# Altium footprint library FootprintSMD.PcbLib: 140 footprints (part 7 of 9)
Each footprint in its own frame and in the unit in brackets; x right, y up, seen from the top. Pads: shape width x height; smd on the part's side, far side on the other; paste and mask are expansions set on the pad; w line width, h text height; cw(c..) or ccw(c..) is an arc to the next point about the centre after c.
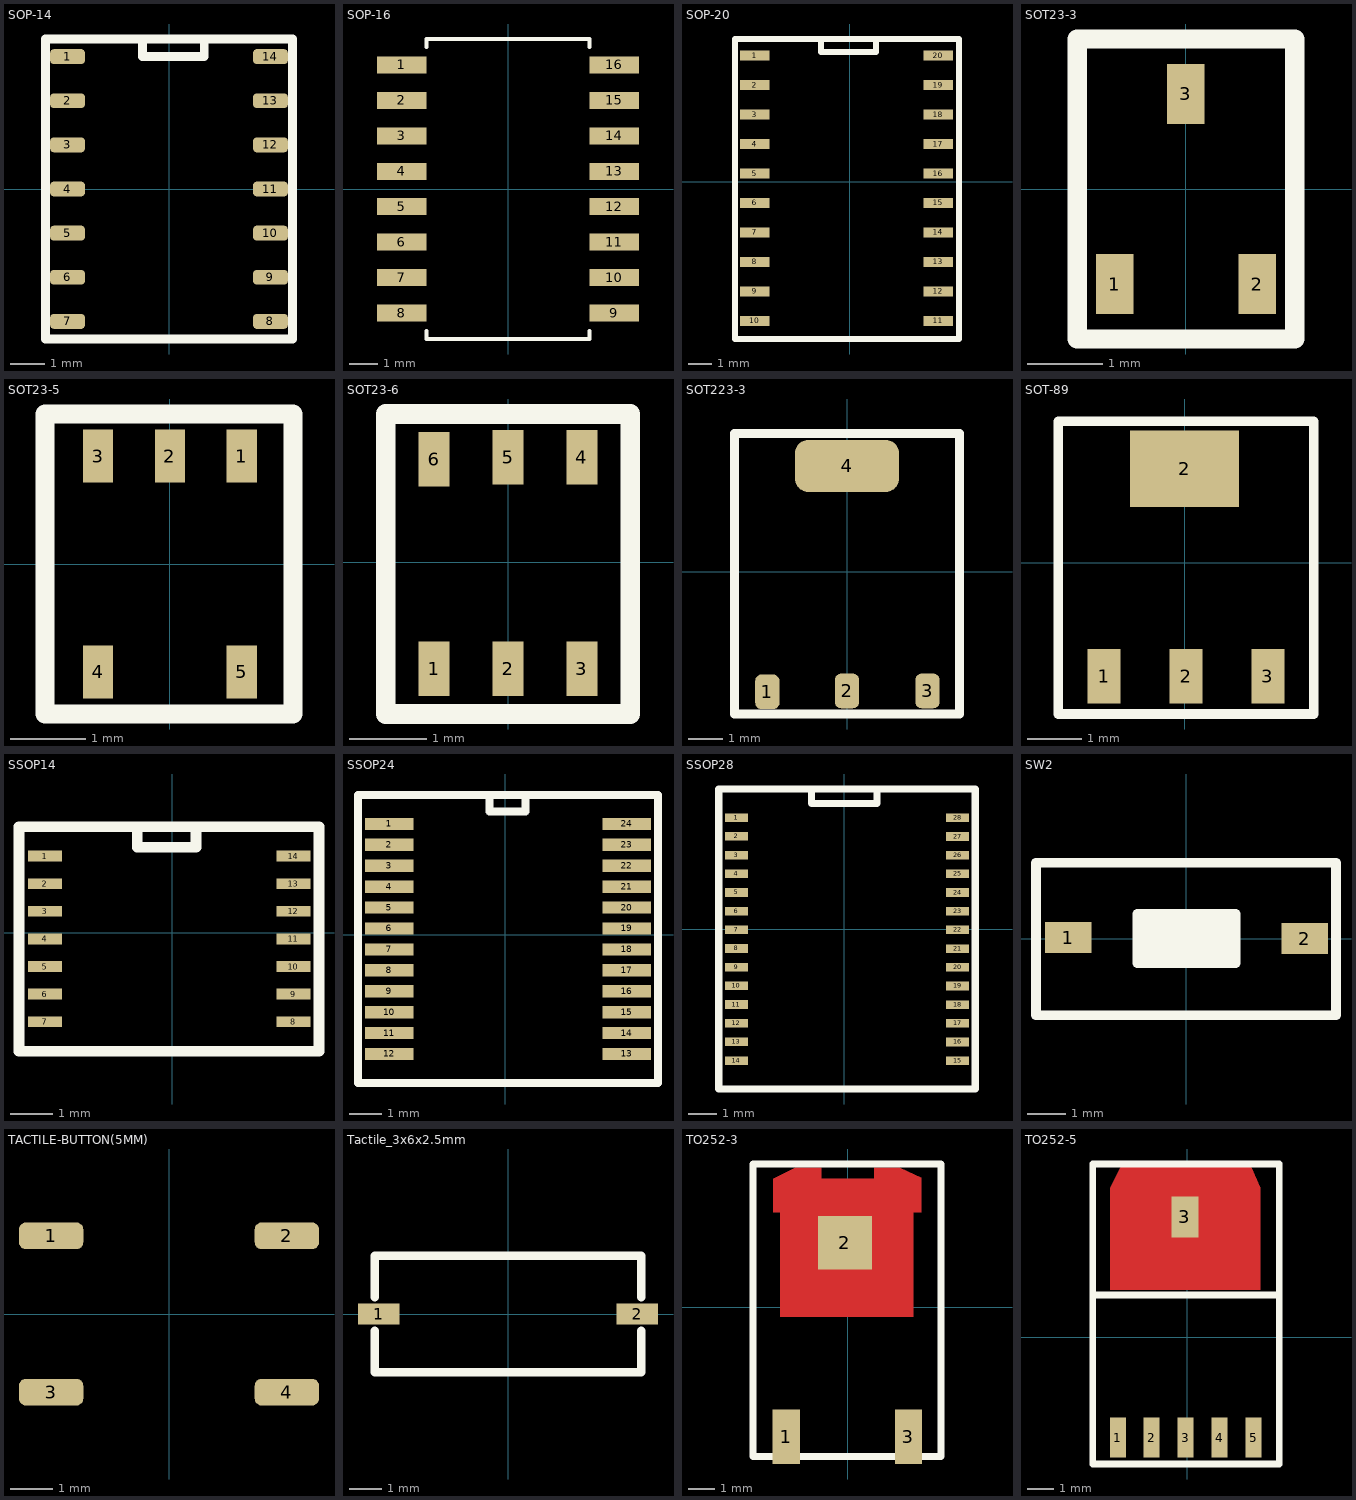
[diagram p6: the footprints below, top view; thin cyan lines are the x and y axes]

## SOP-14 [mm]
pads (14):
  rrect50% 1x0.43 smd: 1(-2.921,3.81) 2(-2.921,2.54) 3(-2.921,1.27) 4(-2.921,0) 5(-2.921,-1.27) 6(-2.921,-2.54) 7(-2.921,-3.81) 8(2.921,-3.81) 9(2.921,-2.54) 10(2.921,-1.27) 11(2.921,0) 12(2.921,1.27) 13(2.921,2.54) 14(2.921,3.81)
Top Overlay:
  lines w0.254: -0.762,4.318 -0.762,3.81 1.016,3.81 1.016,4.318 ; -3.556,-4.318 3.556,-4.318 3.556,4.318 -3.556,4.318 -3.556,-4.318
3D body "User Library-14-SOP.STEP": height 1.8, standoff 0, extent -3,-4.28 3,4.28

## SOP-16 [mil]
pads (16):
  rect 70x24 smd paste+0 mask+0: 1(-150,175) 2(-150,125) 3(-150,75) 4(-150,25) 5(-150,-25) 6(-150,-75) 7(-150,-125) 8(-150,-175) 9(150,-175) 10(150,-125) 11(150,-75) 12(150,-25) 13(150,25) 14(150,75) 15(150,125) 16(150,175)
Top Overlay:
  lines w6: -115,-200.1 -115,-211.5 115,-211.5 115,-200.1 ; -115,200.1 -115,211.5 115,211.5 115,200.1
3D body "NS16-M.step": height 79.09, standoff 0, extent -161.49,-206.49 161.51,206.51

## SOP-20 [mm]
pads (20):
  rect 1.27x0.432 smd: 1(-4.1,5.43) 2(-4.1,4.16) 3(-4.1,2.89) 4(-4.1,1.62) 5(-4.1,0.35) 6(-4.1,-0.92) 7(-4.1,-2.19) 8(-4.1,-3.46) 9(-4.1,-4.73) 10(-4.1,-6) 11(3.799,-6) 12(3.799,-4.73) 13(3.799,-3.46) 14(3.799,-2.19) 15(3.799,-0.92) 16(3.799,0.35) 17(3.799,1.62) 18(3.799,2.89) 19(3.799,4.16) 20(3.799,5.43)
Top Overlay:
  lines w0.254: -1.25,6.121 -1.25,5.588 1.125,5.588 1.125,6.147 ; -4.953,-6.782 4.699,-6.782 4.699,6.147 -4.953,6.147 -4.953,-6.782
3D body "User Library-SOP20.STEP": height 2, standoff 0, extent -4.227,-6.648 3.873,6.052

## SOT23-3 [mm]
pads (3):
  rect 0.5x0.8 smd: 1(-0.95,-1.27) 2(0.95,-1.27) 3(0,1.27)
Top Overlay:
  lines w0.254: -1.45,-2 -1.45,2 1.45,2 1.45,-2 -1.45,-2
3D body "User Library-SOT23-3.STEP": height 1.3, standoff 0, extent -1.45,-1.4 1.45,1.4

## SOT23-5 [mm]
pads (5):
  rect 0.4x0.7 smd: 1(0.95,1.424) 2(0,1.424) 3(-0.95,1.424) 4(-0.95,-1.425) 5(0.95,-1.425)
Top Overlay:
  lines w0.254: -1.651,-1.981 1.626,-1.981 1.626,1.981 -1.651,1.981 -1.651,-1.981
3D body "User Library-SOT-23-5.STEP": height 1.45, standoff -0.01, extent -1.5,-1.5 1.5,1.5

## SOT23-6 [mm]
pads (6):
  rect 0.4x0.7 smd: 1(-0.95,-1.375) 2(0,-1.375) 3(0.95,-1.375) 4(0.95,1.35) 5(0,1.35) 6(-0.95,1.325)
Top Overlay:
  lines w0.254: -1.575,-1.956 -1.575,1.905 1.575,1.905 1.575,-1.956 -1.575,-1.956
3D body "User Library-SOT23-6-2.STEP": height 1.45, standoff 0, extent -1.45,-1.4 1.45,1.4

## SOT223-3 [mm]
pads (4):
  rrect50% 0.7x1 smd: 1(-2.3,-3.475) 2(0,-3.45) 3(2.325,-3.45)
  rrect50% 3x1.5 smd: 4(0,3.048)
Top Overlay:
  lines w0.254: -3.25,-4.115 3.25,-4.115 3.25,3.988 -3.25,3.988 -3.25,-4.115
3D body "User Library-SOT223-3.STEP": height 1.7, standoff 0, extent -3.25,-3.5 3.25,3.5

## SOT-89 [mm]
pads (4):
  rect 0.6x1 smd: 1(-1.475,-2.075) 2(0.027,-2.079) 3(1.525,-2.075)
  rect 2x1.4 smd: 2(0,1.725)
Top Overlay:
  lines w0.178: -2.311,-2.769 2.362,-2.769 2.362,2.591 -2.311,2.591 -2.311,-2.769
3D body "User Library-SOT-89-1.step": height 1.51, standoff 0, extent -2.223,-2.304 2.277,1.996

## SSOP14 [mm]
pads (14):
  rect 0.8x0.254 smd: 1(-3,1.8) 2(-3,1.15) 3(-3,0.5) 4(-3,-0.15) 5(-3,-0.8) 6(-3,-1.45) 7(-3,-2.1) 8(2.85,-2.1) 9(2.85,-1.45) 10(2.85,-0.8) 11(2.85,-0.15) 12(2.85,0.5) 13(2.85,1.15) 14(2.85,1.8)
Top Overlay:
  lines w0.254: -0.826,2.464 -0.826,2.007 0.559,2.007 0.559,2.464 ; -3.607,-2.794 -3.607,2.489 3.454,2.489 3.454,-2.794 -3.607,-2.794
3D body "User Library-SSOP14-P065.STEP": height 1.73, standoff -0.08, extent -3.075,-2.65 2.925,2.35

## SSOP24 [mm]
pads (24):
  rect 1.5x0.38 smd: 1(-3.6,3.45) 2(-3.6,2.8) 3(-3.6,2.15) 4(-3.6,1.5) 5(-3.6,0.85) 6(-3.6,0.2) 7(-3.6,-0.45) 8(-3.6,-1.1) 9(-3.6,-1.75) 10(-3.6,-2.4) 11(-3.6,-3.05) 12(-3.6,-3.7) 13(3.775,-3.7) 14(3.775,-3.05) 15(3.775,-2.4) 16(3.775,-1.75) 17(3.775,-1.1) 18(3.775,-0.45) 19(3.775,0.2) 20(3.775,0.85) 21(3.775,1.5) 22(3.775,2.15) 23(3.775,2.8) 24(3.775,3.45)
Top Overlay:
  lines w0.254: -0.483,4.343 -0.483,3.835 0.635,3.835 0.635,4.293 ; -4.572,-4.597 -4.572,4.343 4.75,4.343 4.75,-4.597 -4.572,-4.597
3D body "User Library-SSOP 24 PIN_.STEP": height 1.93, standoff -0.06, extent -3.85,-4.43 4.05,4.2

## SSOP28 [mm]
pads (28):
  rect 0.8x0.3 smd: 1(-3.76,3.877) 2(-3.76,3.227) 3(-3.76,2.577) 4(-3.76,1.927) 5(-3.76,1.277) 6(-3.76,0.627) 7(-3.76,-0.023) 8(-3.76,-0.673) 9(-3.76,-1.323) 10(-3.76,-1.973) 11(-3.76,-2.623) 12(-3.76,-3.273) 13(-3.76,-3.923) 14(-3.76,-4.573) 15(3.937,-4.577) 16(3.937,-3.926) 17(3.937,-3.277) 18(3.937,-2.626) 19(3.937,-1.977) 20(3.937,-1.326) 21(3.937,-0.677) 22(3.937,-0.026) 23(3.937,0.623) 24(3.937,1.274) 25(3.937,1.923) 26(3.937,2.574) 27(3.937,3.223) 28(3.937,3.873)
Top Overlay:
  lines w0.254: -1.143,4.826 -1.143,4.369 1.13,4.369 1.13,4.864 ; -4.369,-5.563 3.492,-5.563 4.547,-5.563 4.547,4.877 -4.369,4.877 -4.369,-5.563
3D body "User Library-SSOP-28-3.STEP": height 1.9, standoff 0, extent -3.775,-5.425 4.025,4.775

## SW2 [mm]
pads (2):
  rect 1.2x0.8 smd: 1(-3.048,0.025) 2(3.048,0)
Top Overlay:
  rectangle: -1.27,-0.635 1.27,0.635
  lines w0.254: -3.886,-1.981 -3.886,1.956 3.861,1.956 3.861,-1.981 -3.886,-1.981 ; -1.27,-0.635 1.27,-0.635 1.27,0.635 -1.27,0.635 -1.27,-0.635
3D body "User Library-Button-SMD.step": height 2.5, standoff 0, extent -3.05,-1.85 3.05,1.85

## TACTILE-BUTTON(5MM) [mil]
pads (4):
  rrect50% 60x25 smd: 1(-110,73) 2(110,73) 3(-110,-73) 4(110,-73)
3D body "TactileButton(5mm)_SMD.stp": height 59.06, standoff 0, extent -126.57,-100.79 127.37,100

## Tactile_3x6x2.5mm [mil]
pads (2):
  rect 50x25 smd: 1(-155,0) 2(155,0)
Top Overlay:
  lines w10: -160,-20 -160,-70 160,-70 160,-20 ; -160,20 -160,70 160,70 160,20
3D body "Tactile_SMD_3x6x2.5mm.SLDPRT": height 99, standoff 0, extent -158.49,-71.99 158.5,72.01

## TO252-3 [mil]
pads (3):
  rect 40x80 smd: 1(-89.94,-189.83) 3(89.06,-189.83)
  rect 78.74x78.74 smd: 2(-3.94,94.49)
Top Layer:
  region: -76.94,204.17 -108.94,188.17 -108.94,139.17 -98.94,139.17 -98.94,-13.83 96.06,-13.83 96.06,139.17 108.06,139.17 108.06,189.54 76.06,204.17 39.06,204.17 39.06,188.17 -38.94,188.17 -38.94,204.17
Top Overlay:
  lines w10: -139,-219 137,-219 137,210 -139,210 -139,-219
3D body "User Library-DPAK_TO-252AA.STEP": height 93.31, standoff -1.18, extent -133.49,-193.91 131.62,203.72

## TO252-5 [mil]
pads (6):
  rect 23.62x59.06 smd: 1(-102,-148) 2(-52,-148) 3(-2,-148) 4(48,-148) 5(98,-148)
  rect 39.37x60 smd: 3(-3,177)
Top Layer:
  region: -98,250 -113,220 -113,70 108,70 108,220 95,250
Top Overlay:
  lines w10: -132.88,62 131,62 ; -139,-187 136,-187 136,255 -139,255 -139,-187
3D body "User Library-DPAK-5.STEP": height 94.49, standoff -0.04, extent -133.88,-156.18 129.9,249.3